# Altium footprint library NG2092.PcbLib: 32 footprints (part 2 of 2)
Each footprint in its own frame and in the unit in brackets; x right, y up, seen from the top. Pads: shape width x height; smd on the part's side, far side on the other; paste and mask are expansions set on the pad; w line width, h text height; cw(c..) or ccw(c..) is an arc to the next point about the centre after c.
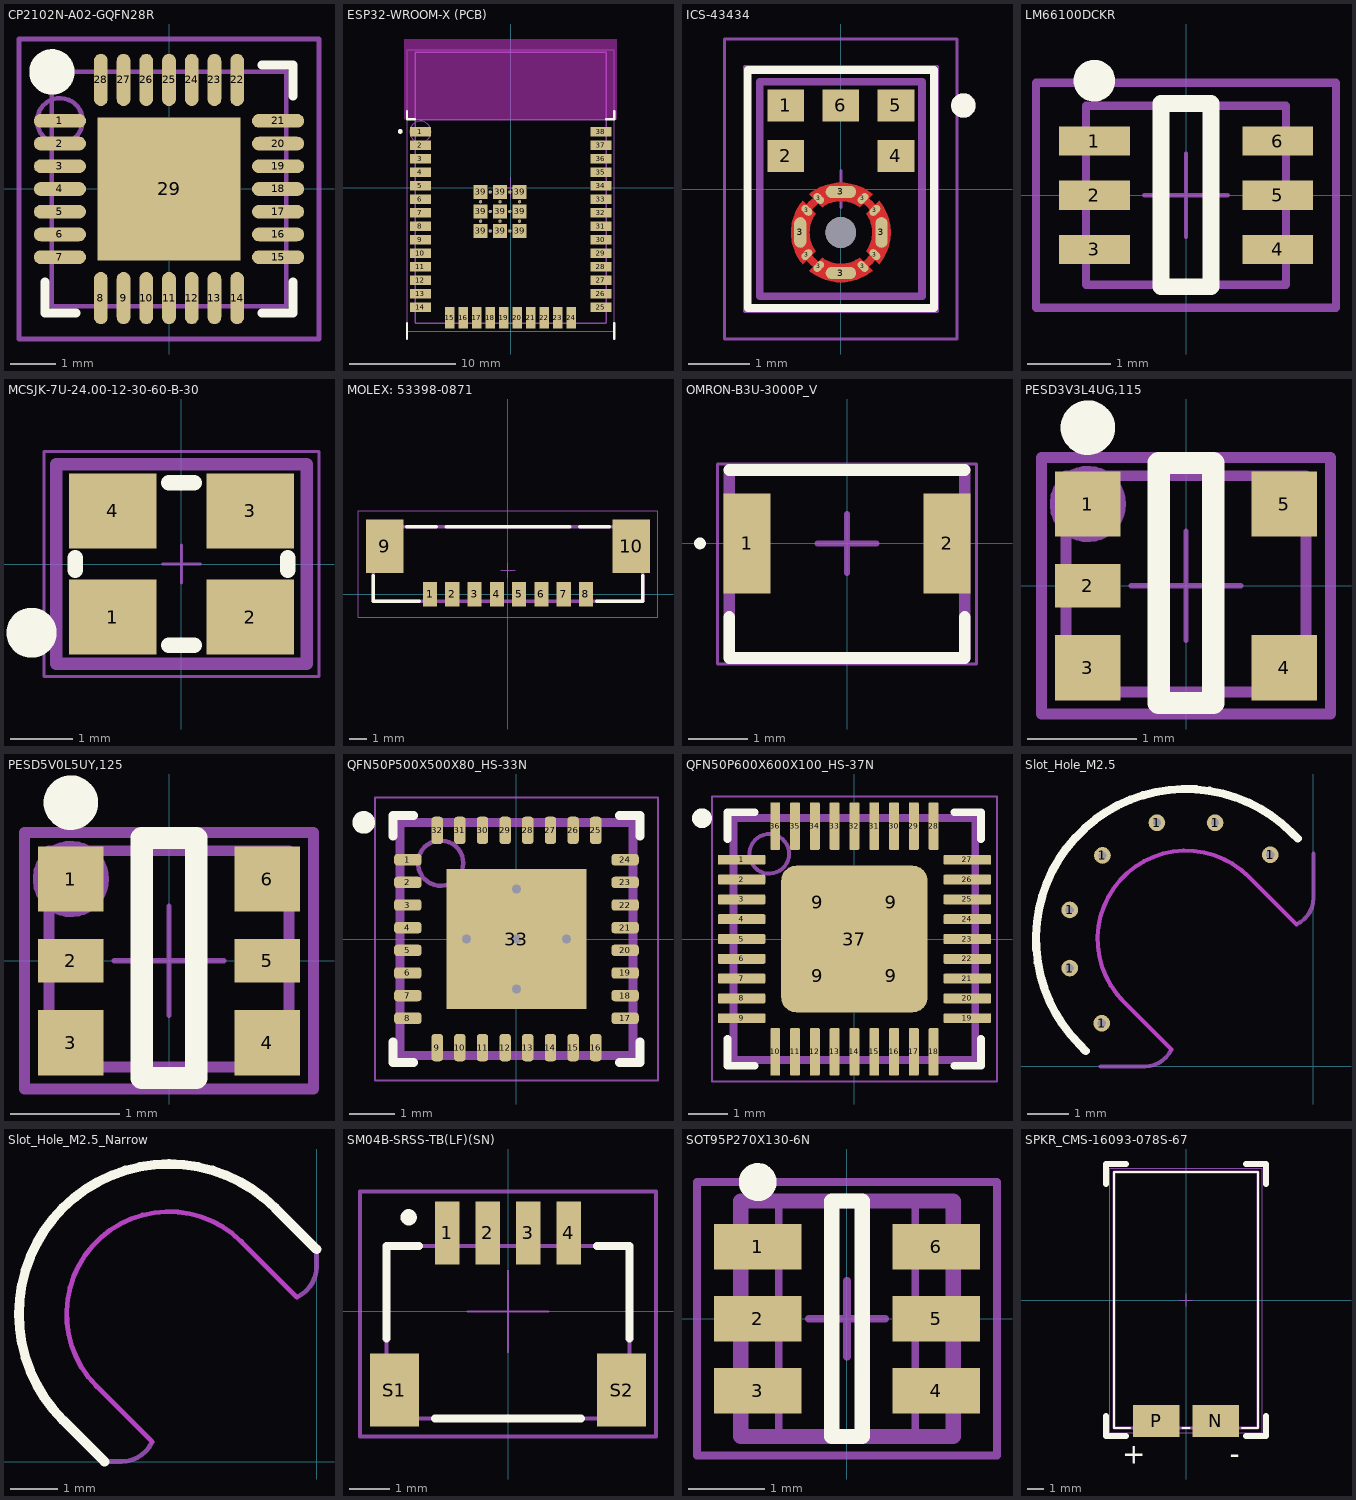
[diagram p1: the footprints below, top view; thin cyan lines are the x and y axes]

## CP2102N-A02-GQFN28R [mm] "QFN, 28-Leads, Body 5.00x5.00mm, Pitch 0.50mm, Thermal Pad 3.15x3.15mm, IPC Medium Density"
height 1
pads (29):
  oval 1.15x0.3 smd: 1(-2.4,1.5) 2(-2.4,1) 3(-2.4,0.5) 4(-2.4,0) 5(-2.4,-0.5) 6(-2.4,-1) 7(-2.4,-1.5) 15(2.4,-1.5) 16(2.4,-1) 17(2.4,-0.5) 18(2.4,0) 19(2.4,0.5) 20(2.4,1) 21(2.4,1.5)
  oval 0.3x1.15 smd: 8(-1.5,-2.4) 9(-1,-2.4) 10(-0.5,-2.4) 11(0,-2.4) 12(0.5,-2.4) 13(1,-2.4) 14(1.5,-2.4) 22(1.5,2.4) 23(1,2.4) 24(0.5,2.4) 25(0,2.4) 26(-0.5,2.4) 27(-1,2.4) 28(-1.5,2.4)
  rect 3.15x3.15 smd paste-0.635: 29(0,0)
Top Overlay:
  circle w0.5: c-2.575,2.575 r0.25
  lines w0.2: -2.725,-2.05 -2.725,-2.725 -2.05,-2.725 ; 2.05,-2.725 2.725,-2.725 2.725,-2.05 ; 2.05,2.725 2.725,2.725 2.725,2.05
Top Assembly:
  circle w0.1: c-2.4,1.5 r0.5
  lines w0.1: -3.3,-3.3 3.3,-3.3 3.3,3.3 -3.3,3.3 -3.3,-3.3
  text "'.Designator'" at -2.418,-0.227 h1
Top Courtyard (Mech15):
  lines w0.05: -0.5,0 0.5,0 ; 0,-0.5 0,0.5 ; -3.3,-3.3 -3.3,3.3 3.3,3.3 3.3,-3.3 -3.3,-3.3
Top Component Outline (Mech31):
  lines w0.1: -2.575,-2.575 -2.575,2.575 2.575,2.575 2.575,-2.575 -2.575,-2.575
3D body: height 1, standoff 0.01, extent -2.575,-2.575 2.575,2.575

## ESP32-WROOM-X (PCB) [mm] "ESP32-WROOM modules, with space left for WROVER"
height 3.2
pads (59):
  rect 2x0.9 smd: 1(-8.5,5.26) 2(-8.5,3.99) 3(-8.5,2.72) 4(-8.5,1.45) 5(-8.5,0.18) 6(-8.5,-1.09) 7(-8.5,-2.36) 8(-8.5,-3.63) 9(-8.5,-4.9) 10(-8.5,-6.17) 11(-8.5,-7.44) 12(-8.5,-8.71) 13(-8.5,-9.98) 14(-8.5,-11.25) 25(8.5,-11.25) 26(8.5,-9.98) 27(8.5,-8.71) 28(8.5,-7.44) 29(8.5,-6.17) 30(8.5,-4.9) 31(8.5,-3.63) 32(8.5,-2.36) 33(8.5,-1.09) 34(8.5,0.18) 35(8.5,1.45) 36(8.5,2.72) 37(8.5,3.99) 38(8.5,5.26)
  rect 0.9x2 smd: 15(-5.715,-12.25) 16(-4.445,-12.25) 17(-3.175,-12.25) 18(-1.905,-12.25) 19(-0.635,-12.25) 20(0.635,-12.25) 21(1.905,-12.25) 22(3.175,-12.25) 23(4.445,-12.25) 24(5.715,-12.25)
  rect 1.33x1.33 smd: 39(-2.835,-4.075) 39(-2.835,-2.24) 39(-2.835,-0.405) 39(-1,-4.075) 39(-1,-2.24) 39(-1,-0.405) 39(0.835,-4.075) 39(0.835,-2.24) 39(0.835,-0.405)
  round 0.3 hole 0.2: 39(-2.835,-3.157) 39(-2.835,-1.322) 39(-1.917,-4.075) 39(-1.917,-2.24) 39(-1.917,-0.405) 39(-1,-3.157) 39(-1,-1.322) 39(-0.082,-4.075) 39(-0.082,-2.24) 39(-0.082,-0.405) 39(0.835,-3.157) 39(0.835,-1.322)
Top Overlay:
  circle w0.25: c-10.4,5.3 r0.1
  lines w0.2: -9.75,-14.244 -9.75,-13.494 -9.75,-12.744 ; -9.75,7.194 -9.75,6.444 -9,6.444 ; 9,6.444 9.75,6.444 9.75,7.194 ; 9.75,-14.25 9.75,-13.5 9.75,-12.75
Top Paste:
  region: 1.5,-4.74 0.17,-4.74 0.17,-3.41 1.5,-3.41
  region: -0.335,-2.905 -1.665,-2.905 -1.665,-1.575 -0.335,-1.575
  region: -2.17,-2.905 -3.5,-2.905 -3.5,-1.575 -2.17,-1.575
  region: 1.5,-2.905 0.17,-2.905 0.17,-1.575 1.5,-1.575
  region: 1.5,-1.07 0.17,-1.07 0.17,0.26 1.5,0.26
  region: -0.335,-1.07 -1.665,-1.07 -1.665,0.26 -0.335,0.26
  region: -2.17,-1.07 -3.5,-1.07 -3.5,0.26 -2.17,0.26
  region: -2.17,-4.74 -3.5,-4.74 -3.5,-3.41 -2.17,-3.41
  region: -0.335,-4.74 -1.665,-4.74 -1.665,-3.41 -0.335,-3.41
Top Solder:
  region: -0.335,-2.905 -1.665,-2.905 -1.665,-1.575 -0.335,-1.575
  region: -2.17,-2.905 -3.5,-2.905 -3.5,-1.575 -2.17,-1.575
  region: 1.5,-2.905 0.17,-2.905 0.17,-1.575 1.5,-1.575
  region: 1.5,-1.07 0.17,-1.07 0.17,0.26 1.5,0.26
  region: -0.335,-1.07 -1.665,-1.07 -1.665,0.26 -0.335,0.26
  region: -2.17,-1.07 -3.5,-1.07 -3.5,0.26 -2.17,0.26
  region: -2.17,-4.74 -3.5,-4.74 -3.5,-3.41 -2.17,-3.41
  region: -0.335,-4.74 -1.665,-4.74 -1.665,-3.41 -0.335,-3.41
  region: 1.5,-4.74 0.17,-4.74 0.17,-3.41 1.5,-3.41
Keep-Out Layer:
  region: 9,6.45 -9,6.45 -9,12.75 9,12.75
  region: 10,6.45 -10,6.45 -10,14 10,14
Top Assembly:
  circle w0.1: c-8.5,5.26 r1
  lines w0.1: -9.75,-13.494 -9.75,13 9.75,13 9.75,-13.5 ; -9.75,6 -9.75,-13.5 9.75,-13.5 ; -9.75,6.444 9.75,6.444 ; 9.75,6 9.75,-13.5
  text "'.Designator'" at -2.418,-0.227 h1
  text "PCB ANTENNA" at -6,9 h2
  text "WROOM" at -2,-12.739 h1
Top 3D Body:
Top Courtyard (Mech15):
  lines w0.05: -9.75,-13.494 -9.75,13 9.75,13 9.75,-13.5 ; -9.75,6 -9.75,-13.5 9.75,-13.5 ; -1,0 0,0 ; 0,-1 0,0 ; 0,1 0,0 ; 1,0 0,0 ; 9.75,6 9.75,-13.5
Top Component Outline (Mech31):
  lines w0.127: -9,-12.75 9,-12.75 ; -9,-12.74 -9,6.4 ; -9,12.7 -9,6.4 ; -9,12.75 9,12.75 ; 9,-12.74 9,6.4 ; 9,12.7 9,6.4 ; -9,6.4 9,6.4
3D body "ESP32-WROOM-32D--3DModel-STEP-56544.STEP": height 3.3, standoff 0.05, extent -9,-12.74 9,12.76

## ICS-43434 [mm]
pads (18):
  rect 0.6x0.522 smd mask+0.05: 1(-0.9,1.364) 2(-0.9,0.542) 4(0.9,0.542) 5(0.9,1.364) 6(0,1.364)
  oval 0.2x0.5 smd paste-1 mask+0: 3(-0.663,-0.71) 3(0.663,-0.71)
  oval 0.2x0.125 smd rot 45 paste-1 mask+0: 3(-0.555,-1.071) 3(-0.361,-1.265) 3(0.361,-0.155) 3(0.555,-0.349)
  oval 0.2x0.125 smd rot 135 paste-1 mask+0: 3(-0.555,-0.349) 3(-0.361,-0.155) 3(0.361,-1.265) 3(0.555,-1.071)
  oval 0.5x0.2 smd paste-1 mask+0: 3(0,-1.372) 3(0,-0.048)
  round 0.5 hole 0.5 unplated: ""(0,-0.71)
Top Layer:
  region: 0.037,0.102 0.075,0.099 0.112,0.095 0.149,0.089 0.186,0.081 0.222,0.071 0.258,0.06 0.293,0.047 0.328,0.033 0.362,0.017 0.395,-0.001 0.427,-0.02 0.458,-0.041 0.489,-0.063 0.518,-0.086 0.306,-0.298 0.284,-0.283 0.266,-0.271 0.247,-0.26 0.228,-0.25 0.208,-0.241 0.188,-0.233 0.167,-0.225 0.146,-0.219 0.125,-0.213 0.104,-0.208 0.082,-0.204 0.061,-0.201 0.039,-0.199 0.017,-0.198 -0.004,-0.197 -0.026,-0.198 -0.048,-0.2 -0.07,-0.202 -0.091,-0.205 -0.113,-0.21 -0.134,-0.215 -0.155,-0.221 -0.176,-0.228 -0.196,-0.236 -0.216,-0.245 -0.236,-0.254 -0.255,-0.265 -0.273,-0.276 -0.292,-0.288 -0.306,-0.298 -0.518,-0.086 -0.489,-0.063 -0.458,-0.041 -0.427,-0.02 -0.395,-0.001 -0.362,0.017 -0.328,0.033 -0.293,0.047 -0.258,0.06 -0.222,0.071 -0.186,0.081 -0.149,0.089 -0.112,0.095 -0.075,0.099 -0.037,0.102 0,0.103
  region: 0.647,-0.221 0.669,-0.252 0.69,-0.283 0.709,-0.315 0.727,-0.348 0.743,-0.382 0.757,-0.417 0.77,-0.452 0.781,-0.488 0.791,-0.524 0.799,-0.561 0.805,-0.598 0.809,-0.635 0.812,-0.673 0.813,-0.71 0.812,-0.747 0.809,-0.785 0.805,-0.822 0.799,-0.859 0.791,-0.896 0.781,-0.932 0.77,-0.968 0.757,-1.003 0.743,-1.038 0.727,-1.072 0.709,-1.105 0.69,-1.137 0.669,-1.168 0.647,-1.199 0.624,-1.228 0.412,-1.016 0.422,-1.002 0.434,-0.983 0.445,-0.965 0.456,-0.946 0.465,-0.926 0.474,-0.906 0.482,-0.886 0.489,-0.865 0.495,-0.844 0.5,-0.823 0.505,-0.801 0.508,-0.78 0.51,-0.758 0.512,-0.736 0.513,-0.714 0.512,-0.693 0.511,-0.671 0.509,-0.649 0.506,-0.628 0.502,-0.606 0.497,-0.585 0.491,-0.564 0.485,-0.543 0.477,-0.522 0.469,-0.502 0.46,-0.482 0.45,-0.463 0.439,-0.444 0.427,-0.426 0.412,-0.404 0.624,-0.192
  region: 0.518,-1.334 0.489,-1.357 0.458,-1.379 0.427,-1.4 0.395,-1.419 0.362,-1.437 0.328,-1.453 0.293,-1.467 0.258,-1.48 0.222,-1.491 0.186,-1.501 0.149,-1.509 0.112,-1.515 0.075,-1.519 0.037,-1.522 0,-1.523 -0.037,-1.522 -0.075,-1.519 -0.112,-1.515 -0.149,-1.509 -0.186,-1.501 -0.222,-1.491 -0.258,-1.48 -0.293,-1.467 -0.328,-1.453 -0.362,-1.437 -0.395,-1.419 -0.427,-1.4 -0.458,-1.379 -0.489,-1.357 -0.518,-1.334 -0.306,-1.122 -0.292,-1.132 -0.273,-1.144 -0.255,-1.155 -0.236,-1.166 -0.216,-1.175 -0.196,-1.184 -0.176,-1.192 -0.155,-1.199 -0.134,-1.205 -0.113,-1.21 -0.091,-1.215 -0.07,-1.218 -0.048,-1.22 -0.026,-1.222 -0.004,-1.223 0.017,-1.222 0.039,-1.221 0.061,-1.219 0.082,-1.216 0.104,-1.212 0.125,-1.207 0.146,-1.201 0.167,-1.195 0.188,-1.187 0.208,-1.179 0.228,-1.17 0.247,-1.16 0.266,-1.149 0.284,-1.137 0.306,-1.122
  region: -0.412,-0.404 -0.427,-0.425 -0.438,-0.444 -0.449,-0.462 -0.459,-0.481 -0.468,-0.501 -0.477,-0.521 -0.484,-0.541 -0.491,-0.561 -0.497,-0.582 -0.501,-0.603 -0.506,-0.624 -0.509,-0.646 -0.511,-0.667 -0.512,-0.688 -0.513,-0.71 -0.512,-0.732 -0.511,-0.753 -0.509,-0.774 -0.506,-0.796 -0.501,-0.817 -0.497,-0.838 -0.491,-0.859 -0.484,-0.879 -0.477,-0.899 -0.468,-0.919 -0.459,-0.939 -0.449,-0.958 -0.438,-0.976 -0.427,-0.995 -0.412,-1.016 -0.624,-1.228 -0.647,-1.199 -0.669,-1.168 -0.69,-1.137 -0.709,-1.105 -0.727,-1.072 -0.743,-1.038 -0.757,-1.003 -0.77,-0.968 -0.781,-0.932 -0.791,-0.896 -0.799,-0.859 -0.805,-0.822 -0.809,-0.785 -0.812,-0.747 -0.813,-0.71 -0.812,-0.673 -0.809,-0.635 -0.805,-0.598 -0.799,-0.561 -0.791,-0.524 -0.781,-0.488 -0.77,-0.452 -0.757,-0.417 -0.743,-0.382 -0.727,-0.348 -0.709,-0.315 -0.69,-0.283 -0.669,-0.252 -0.647,-0.221 -0.624,-0.192
  lines w0.125: 0,-1.372 ccw(c0,-0.71) 0.663,-0.71 ccw(c0,-0.71) 0,-0.048 ccw(c0,-0.71) -0.663,-0.71 ccw(c0,-0.71) 0,-1.372 ; 0,-1.372 0,-1.372 ; 0,-1.372 0,-1.372
Top Overlay:
  circle w0.2: c2,1.364 r0.1
  lines w0.127: -1.52,-1.945 1.52,-1.945 1.52,1.945 -1.52,1.945 -1.52,-1.945
Top Paste:
  drawing of 4 lines, arcs and shapes, not listed
Top Solder:
  drawing of 4 lines, arcs and shapes, not listed
Top Assembly:
  lines w0.05: -1.575,-2 1.575,-2 1.575,2 -1.575,2 -1.575,-2
  text "'.Designator'" at -2.418,-0.227 h1
Top Courtyard (Mech15):
  lines w0.05: -0.3,0 0.3,0 ; 0,-0.3 0,0.3 ; -1.9,-2.45 -1.9,2.45 1.9,2.45 1.9,-2.45 -1.9,-2.45
Top Component Outline (Mech31):
  circle w0.2: c2,1.364 r0.1
  lines w0.127: -1.325,-1.75 1.325,-1.75 1.325,1.75 -1.325,1.75 -1.325,-1.75
3D body "ICS-43434--3DModel-STEP-56544.STEP": height 0.98, standoff 0, extent -1.325,-1.75 1.325,1.75

## LM66100DCKR [mm] "SOT23, 6-Leads, Body 2.00x2.10mm, Pitch 0.65mm, IPC Medium Density"
height 1.1
pads (6):
  rect 0.85x0.35 smd: 1(-1.1,0.65) 2(-1.1,0) 3(-1.1,-0.65) 4(1.1,-0.65) 5(1.1,0) 6(1.1,0.65)
Top Overlay:
  circle w0.25: c-1.1,1.375 r0.125
  lines w0.2: -0.3,-1.1 -0.3,1.1 0.3,1.1 0.3,-1.1 -0.3,-1.1
Top Assembly:
  lines w0.1: -1.8,-1.35 1.8,-1.35 1.8,1.35 -1.8,1.35 -1.8,-1.35
  text "'.Designator'" at -2.418,-0.227 h1
Top Courtyard (Mech15):
  lines w0.05: -0.5,0 0.5,0 ; 0,-0.5 0,0.5 ; -1.8,-1.35 1.8,-1.35 1.8,1.35 -1.8,1.35 -1.8,-1.35
Top Component Outline (Mech31):
  lines w0.1: -1.2,-1.075 1.2,-1.075 1.2,1.075 -1.2,1.075 -1.2,-1.075
3D body "SOT65P210X110-6N.step": height 1.1, standoff 0, extent -1.2,-1.075 1.2,1.075

## MCSJK-7U-24.00-12-30-60-B-30 [mm]
pads (4):
  rect 1.4x1.2 smd paste-10 mask+0.05: 1(-1.1,-0.85) 2(1.1,-0.85) 3(1.1,0.85) 4(-1.1,0.85)
Top Overlay:
  circle w0.4: c-2.4,-1.1 r0.2
  lines w0.254: -1.7,-0.1 -1.7,0.1 ; -0.2,-1.3 0.2,-1.3 ; -0.2,1.3 0.2,1.3 ; 1.7,-0.1 1.7,0.1
Top Assembly:
  lines w0.05: -2.2,-1.8 2.2,-1.8 2.2,1.8 -2.2,1.8 -2.2,-1.8
  text "'.Designator'" at -2.418,-0.227 h1
Top Courtyard (Mech15):
  lines w0.05: -0.3,0 0.3,0 ; 0,-0.3 0,0.3 ; -2.2,-1.8 2.2,-1.8 2.2,1.8 -2.2,1.8 -2.2,-1.8
Top Component Outline (Mech31):
  lines w0.2: -2,-1.6 -2,1.6 2,1.6 2,-1.6 -2,-1.6
3D body "User Library-Crystal_ECX-32.STEP": height 0.82, standoff 0, extent -1.6,-1.25 1.6,1.25

## MOLEX: 53398-0871 [mm] "SMD Connector; Wafer; 8 Position, Vertical"
pads (10):
  rect 0.8x1.4 smd: 1(-4.375,0) 2(-3.125,0) 3(-1.875,0) 4(-0.625,0) 5(0.625,0) 6(1.875,0) 7(3.125,0) 8(4.375,0)
  rect 2.1x3 smd: 9(-6.925,2.7) 10(6.925,2.7)
Top Overlay:
  lines w0.2: -7.575,1.05 -7.575,-0.4 -5,-0.4 ; -5.675,3.8 -4.025,3.8 ; -3.475,3.8 3.475,3.8 ; 4.025,3.8 5.675,3.8 ; 5,-0.4 7.575,-0.4 7.575,1.05
Top Assembly:
  lines w0.05: -8.4,-1.3 -8.4,4.7 8.4,4.7 8.4,-1.3 -8.4,-1.3
  text "'.Designator'" at -2.418,2.523 h1
Top Courtyard (Mech15):
  lines w0.05: -0.4,1.35 0.4,1.35 ; 0,0.95 0,1.75 ; -8.4,-1.3 -8.4,4.7 8.4,4.7 8.4,-1.3 -8.4,-1.3
Top Component Outline (Mech31):
  lines w0.2: -7.575,-0.4 -7.575,3.8 7.575,3.8 7.575,-0.4 -7.575,-0.4
3D body "533980871.stp": height 4.67, standoff -0.02, extent -7.575,-0.35 7.575,3.85

## OMRON-B3U-3000P_V [mm] "SMD, 2-Leads, Body 4x3.2mm"
height 1.35
pads (2):
  rect 0.8x1.7 smd: 1(-1.7,0) 2(1.7,0)
Top Overlay:
  circle w0.1: c-2.5,0 r0.05
  lines w0.2: -2,-1.25 -2,-1.95 2,-1.95 2,-1.25 ; -2,1.25 2,1.25
Top Assembly:
  lines w0.05: -2.2,-2.05 2.2,-2.05 2.2,1.35 -2.2,1.35 -2.2,-2.05
  text "'.Designator'" at -2.418,-0.227 h1
Top 3D Body (Mech13):
  lines w0.1: -2,-1.95 -2,1.25 2,1.25 2,-1.95 -2,-1.95
Top Courtyard (Mech15):
  lines w0.05: -2.2,-2.05 2.2,-2.05 2.2,1.35 -2.2,1.35 -2.2,-2.05
  lines w0.1: -0.5,0 0.5,0 ; 0,-0.5 0,0.5
Top Component Outline (Mech31):
  lines w0.2: -2,-1.95 2,-1.95 2,1.25 -2,1.25 -2,-1.95
3D body "B3U_3000P[].step": height 1.2, standoff 0, extent -2,-1.95 2,1.25

## PESD3V3L4UG,115 [mm] "5-TSSOP, SC-88, SOT-363"
height 1.1
pads (5):
  rect 0.6x0.6 smd mask+0.076: 1(-0.9,0.75) 3(-0.9,-0.75) 4(0.9,-0.75) 5(0.9,0.75)
  rect 0.6x0.4 smd mask+0.076: 2(-0.9,0)
Top Overlay:
  circle w0.25: c-0.9,1.45 r0.125
  lines w0.203: -0.25,-1.075 0.25,-1.075 0.25,1.125 -0.25,1.125 -0.25,-1.075
Top Assembly:
  circle w0.1: c-0.9,0.75 r0.3
  lines w0.1: -1.325,-1.175 -1.325,1.175 1.325,1.175 1.325,-1.175 -1.325,-1.175
  text "'.Designator'" at -2.418,-0.227 h1
Top Courtyard (Mech15):
  lines w0.05: -0.5,0 0.5,0 ; 0,-0.5 0,0.5 ; -1.325,-1.175 -1.325,1.175 1.325,1.175 1.325,-1.175 -1.325,-1.175
Top Component Outline (Mech31):
  lines w0.1: -1.1,-0.975 1.1,-0.975 1.1,1.009 -1.1,1.009 -1.1,-0.975
3D body "SOT65P210X110-6N.STEP": height 0.99, standoff -0.01, extent -1.1,-0.994 1.1,0.994

## PESD5V0L5UY,125 [mm] "6-TSSOP, SC-88, SOT-363"
height 1.1
pads (6):
  rect 0.6x0.6 smd mask+0.076: 1(-0.9,0.75) 3(-0.9,-0.75) 4(0.9,-0.75) 6(0.9,0.75)
  rect 0.6x0.4 smd mask+0.076: 2(-0.9,0) 5(0.9,0)
Top Overlay:
  circle w0.25: c-0.9,1.45 r0.125
  lines w0.203: -0.25,-1.075 0.25,-1.075 0.25,1.125 -0.25,1.125 -0.25,-1.075
Top Assembly:
  circle w0.1: c-0.9,0.75 r0.3
  lines w0.1: -1.325,-1.175 -1.325,1.175 1.325,1.175 1.325,-1.175 -1.325,-1.175
  text "'.Designator'" at -2.418,-0.227 h1
Top Courtyard (Mech15):
  lines w0.05: -0.5,0 0.5,0 ; 0,-0.5 0,0.5 ; -1.325,-1.175 -1.325,1.175 1.325,1.175 1.325,-1.175 -1.325,-1.175
Top Component Outline (Mech31):
  lines w0.1: -1.1,-0.975 1.1,-0.975 1.1,1.009 -1.1,1.009 -1.1,-0.975
3D body "SOT65P210X110-6N.STEP": height 0.99, standoff -0.01, extent -1.1,-0.994 1.1,0.994

## QFN50P500X500X80_HS-33N [mm] "QFN-32, 32-Leads, Body 5,00x5,00mm, Pitch 0,50mm, Thermal Pad 3,10x3,10mm, IPC Medium Density"
height 0.8
pads (33):
  rrect50% 0.6x0.25 smd paste+0 mask+0.05: 1(-2.4,1.75) 2(-2.4,1.25) 3(-2.4,0.75) 4(-2.4,0.25) 5(-2.4,-0.25) 6(-2.4,-0.75) 7(-2.4,-1.25) 8(-2.4,-1.75) 17(2.4,-1.75) 18(2.4,-1.25) 19(2.4,-0.75) 20(2.4,-0.25) 21(2.4,0.25) 22(2.4,0.75) 23(2.4,1.25) 24(2.4,1.75)
  rrect50% 0.25x0.6 smd paste+0 mask+0.05: 9(-1.75,-2.4) 10(-1.25,-2.4) 11(-0.75,-2.4) 12(-0.25,-2.4) 13(0.25,-2.4) 14(0.75,-2.4) 15(1.25,-2.4) 16(1.75,-2.4) 25(1.75,2.4) 26(1.25,2.4) 27(0.75,2.4) 28(0.25,2.4) 29(-0.25,2.4) 30(-0.75,2.4) 31(-1.25,2.4) 32(-1.75,2.4)
  rect 3.1x3.1 smd paste-10 mask+0.05: 33(0,0)
via 0,-1.1 diameter 0.5 hole 0.2
via 1.1,0 diameter 0.5 hole 0.2
via 0,0 diameter 0.5 hole 0.2
via -1.1,0 diameter 0.5 hole 0.2
via 0,1.1 diameter 0.5 hole 0.2
Top Overlay:
  circle w0.25: c-3.375,2.575 r0.125
  lines w0.2: -2.725,-2.275 -2.725,-2.725 -2.275,-2.725 ; -2.725,2.275 -2.725,2.725 -2.275,2.725 ; 2.275,-2.725 2.725,-2.725 2.725,-2.275 ; 2.275,2.725 2.725,2.725 2.725,2.275
Top Paste:
  rectangle: 0.15,-1.5 1.5,-0.15
  region: -0.15,-0.15 -1.5,-0.15 -1.5,-1.5 -0.15,-1.5
  region: -0.15,1.5 -1.5,1.5 -1.5,0.15 -0.15,0.15
  rectangle: 0.15,0.15 1.5,1.5
Top Assembly:
  circle w0.1: c-1.675,1.675 r0.5
  lines w0.1: -2.575,-2.575 2.575,-2.575 2.575,2.575 -2.575,2.575 -2.575,-2.575
  text "'.Designator'" at -2.418,-0.227 h1
Top Courtyard (Mech15):
  lines w0.05: -3.125,-3.125 3.125,-3.125 3.125,3.125 -3.125,3.125 -3.125,-3.125
  lines w0.1: -0.5,0 0.5,0 ; 0,-0.5 0,0.5
Top Component Outline (Mech31):
  lines w0.2: -2.575,-2.575 2.575,-2.575 2.575,2.575 -2.575,2.575 -2.575,-2.575
3D body "QFN50P500X500X80_HS-33N.step": height 0.8, standoff 0, extent -2.625,-2.625 2.625,2.625

## QFN50P600X600X100_HS-37N [mm] "QFN, 36-Leads, Body 6,00x6,00mm, Pitch 0,50mm, Thermal Pad 3,70x3,70mm, IPC Medium Density"
height 1
pads (41):
  rrect25% 1.2x0.25 smd paste-0.02 mask+0.05: 1(-2.85,2) 2(-2.85,1.5) 3(-2.85,1) 4(-2.85,0.5) 5(-2.85,0) 6(-2.85,-0.5) 7(-2.85,-1) 8(-2.85,-1.5) 9(-2.85,-2) 19(2.85,-2) 20(2.85,-1.5) 21(2.85,-1) 22(2.85,-0.5) 23(2.85,0) 24(2.85,0.5) 25(2.85,1) 26(2.85,1.5) 27(2.85,2)
  rrect25% 1.3x1.3 on Top Paste paste+0 mask-10: 9(-0.925,-0.925) 9(-0.925,0.925) 9(0.925,-0.925) 9(0.925,0.925)
  rrect25% 0.25x1.2 smd paste-0.02 mask+0.05: 10(-2,-2.85) 11(-1.5,-2.85) 12(-1,-2.85) 13(-0.5,-2.85) 14(0,-2.85) 15(0.5,-2.85) 16(1,-2.85) 17(1.5,-2.85) 18(2,-2.85) 28(2,2.85) 29(1.5,2.85) 30(1,2.85) 31(0.5,2.85) 32(0,2.85) 33(-0.5,2.85) 34(-1,2.85) 35(-1.5,2.85) 36(-2,2.85)
  rrect20% 3.7x3.7 smd paste-10 mask+0.05: 37(0,0)
Top Overlay:
  circle w0.25: c-3.85,3.05 r0.125
  lines w0.2: -3.2,-2.525 -3.2,-3.2 -2.525,-3.2 ; -3.2,2.525 -3.2,3.2 -2.525,3.2 ; 2.525,-3.2 3.2,-3.2 3.2,-2.525 ; 2.525,3.2 3.2,3.2 3.2,2.525
Top Assembly:
  lines w0.05: -3.6,-3.6 3.6,-3.6 3.6,3.6 -3.6,3.6 -3.6,-3.6
  text "'.Designator'" at -2.418,-0.227 h1
Top 3D Body (Mech13):
  circle w0.1: c-2.15,2.15 r0.5
  lines w0.1: -3.05,-3.05 3.05,-3.05 3.05,3.05 -3.05,3.05 -3.05,-3.05
Top Courtyard (Mech15):
  lines w0.05: -3.6,-3.6 3.6,-3.6 3.6,3.6 -3.6,3.6 -3.6,-3.6
  lines w0.1: -0.5,0 0.5,0 ; 0,-0.5 0,0.5
Top Component Outline (Mech31):
  lines w0.2: -3.05,-3.05 -3.05,3.05 3.05,3.05 3.05,-3.05 -3.05,-3.05
3D body "QFN50P600X600X100_HS-37N.step": height 1, standoff 0, extent -3.1,-3.1 3.1,3.1

## Slot_Hole_M2.5 [mm]
pads (7):
  round 0.406 hole 0.203 paste-10 mask+0.05: 1(-5.93,2.393) 1(-5.93,3.807) 1(-5.152,1.049) 1(-5.134,5.133) 1(-3.808,5.928) 1(-2.394,5.928) 1(-1.051,5.151)
Top Overlay:
  lines w0.2: -5.543,0.376 -5.682,0.516 -5.682,0.519 cw(c-3.101,3.1) -0.52,5.681 -0.382,5.542
Top Solder:
  region: -5.682,0.519 -5.125,0 -3.455,0 -3.455,0.413 -4.622,1.58
  region: 0,3.454 0,5.125 -0.52,5.681 -1.581,4.62 -0.414,3.454
  lines w1.5: -5.152,1.049 cw(c-3.101,3.1) -1.051,5.151
Bottom Solder:
  region: -5.682,0.519 -5.125,0 -3.455,0 -3.455,0.413 -4.622,1.58
  region: 0,3.454 0,5.125 -0.52,5.681 -1.581,4.62 -0.414,3.454
  lines w1: -4.975,1.226 cw(c-3.101,3.1) -1.227,4.974
Keep-Out Layer:
  lines w0.1: -3.455,0.413 -4.622,1.58 cw(c-3.101,3.1) -1.581,4.62 -0.414,3.454
Board:
  lines w0.1: -5.176,0 -4.101,0 ccw(c-4.101,0.711) -3.457,0.41 ; -3.455,0.413 -4.622,1.58 cw(c-3.101,3.1) -1.581,4.62 -0.414,3.454 ; -0.411,3.457 ccw(c-0.711,4.1) -0.001,4.1 -0.001,5.175

## Slot_Hole_M2.5_Narrow [mm]
Top Overlay:
  lines w0.2: -4.455,0 -5.327,0.873 ; 0,4.455 -0.873,5.327 ccw(c-3.1,3.1) -5.327,0.873 ; -5.327,0.873 -5.327,0.873
Top Solder:
  region: -5.327,0.873 -4.455,0 -3.75,0.05 -3.453,0.413 -4.62,1.58
  region: -0.033,3.833 0,4.455 -0.873,5.327 -1.58,4.62 -0.413,3.454
  lines w1: -4.974,1.226 cw(c-3.1,3.1) -1.226,4.974
Bottom Solder:
  region: -0.033,3.833 0,4.455 -0.873,5.327 -1.58,4.62 -0.413,3.454
  region: -5.327,0.873 -4.455,0 -3.75,0.05 -3.453,0.413 -4.62,1.58
  lines w1: -4.974,1.226 cw(c-3.1,3.1) -1.226,4.974
Keep-Out Layer:
  lines w0.1: -3.453,0.413 -4.62,1.58 cw(c-3.1,3.1) -1.58,4.62 -0.413,3.454
Board:
  lines w0.1: -4.455,0 -4.1,0 ccw(c-4.1,0.711) -3.456,0.41 ; -3.453,0.413 -4.62,1.58 cw(c-3.1,3.1) -1.58,4.62 -0.413,3.454 ; -0.41,3.457 ccw(c-0.71,4.1) 0,4.1 0,4.455

## SM04B-SRSS-TB(LF)(SN) [mm] "Connector Header Surface Mount, Right Angle 4 position 0.039\" (1.00mm)"
height 2.9
pads (6):
  rect 0.6x1.55 smd: 1(-1.5,1.938) 2(-0.5,1.938) 3(0.5,1.938) 4(1.5,1.938)
  rect 1.2x1.8 smd: S1(-2.8,-1.937) S2(2.8,-1.937)
Top Overlay:
  circle w0.2: c-2.45,2.323 r0.1
  lines w0.2: -3,-0.662 -3,1.613 -2.2,1.613 ; -1.8,-2.637 1.8,-2.637 ; 2.2,1.613 3,1.613 3,-0.662
Top Assembly:
  lines w0.1: -3.65,-3.087 3.65,-3.087 3.65,2.963 -3.65,2.963 -3.65,-3.087
  text "'.Designator'" at -2.418,-0.227 h1
Top Courtyard (Mech15):
  lines w0.05: -1,0 0,0 ; 0,-1 0,0 ; 0,1 0,0 ; 1,0 0,0 ; -3.65,-3.087 -3.65,2.963 3.65,2.963 3.65,-3.087 -3.65,-3.087
Top Component Outline (Mech31):
  lines w0.1: -3,-2.637 -3,1.613 3,1.613 3,-2.637 -3,-2.637
3D body "SM04B-SRSS-TB(LF)(SN)--3DModel-STEP-56544.STEP": height 2.96, standoff 0, extent -3,-2.638 3,2.312

## SOT95P270X130-6N [mm] "SOT23, 6-Leads, Body 3,1x3,2mm (max), Pitch 0,95mm, IPC Medium Density"
height 1.3
pads (6):
  rect 1.15x0.6 smd mask+0.05: 1(-1.175,0.95) 2(-1.175,0) 3(-1.175,-0.95) 4(1.175,-0.95) 5(1.175,0) 6(1.175,0.95)
Top Overlay:
  circle w0.25: c-1.175,1.8 r0.125
  lines w0.2: -0.2,-1.55 0.2,-1.55 0.2,1.55 -0.2,1.55 -0.2,-1.55
Top Assembly:
  lines w0.1: -1.975,-1.8 -1.975,1.8 1.975,1.8 1.975,-1.8 -1.975,-1.8
  text "'.Designator'" at -2.418,-0.227 h1
Top 3D Body (Mech13):
  lines w0.1: -0.9,-1.55 -0.9,1.55 0.9,1.55 0.9,-1.55 -0.9,-1.55
Top Courtyard (Mech15):
  lines w0.1: -0.5,0 0.5,0 ; 0,-0.5 0,0.5 ; -1.975,-1.8 -1.975,1.8 1.975,1.8 1.975,-1.8 -1.975,-1.8
Top Component Outline (Mech31):
  lines w0.2: -1.4,-1.55 -0.2,-1.55 0.2,-1.55 1.4,-1.55 1.4,1.55 0.2,1.55 -0.2,1.55 -1.4,1.55 -1.4,-1.55
3D body: height 1.3, standoff 0.1, extent -0.9,-1.55 0.9,1.55

## SPKR_CMS-16093-078S-67 [mm]
pads (2):
  rect 2.9x2 smd: N(1.85,-7.55) P(-1.85,-7.55)
Top Overlay:
  lines w0.127: -3.505,-8 -4.5,-8 -4.5,8 4.5,8 4.5,-8 3.505,-8 ; -0.203,-8.001 0.203,-8.001
  lines w0.35: -5,-7.25 -5,-8.5 -3.75,-8.5 ; -5,7.25 -5,8.5 -3.75,8.5 ; 3.75,-8.5 5,-8.5 5,-7.25 ; 3.75,8.5 5,8.5 5,7.25
  text "-" at 2.75,-10.25 h1.27
  text "+" at -4,-10.25 h1.27
Top Assembly:
  lines w0.05: -4.75,-8.3 -4.75,8.25 4.75,8.25 4.75,-8.3 -4.75,-8.3
  text "'.Designator'" at -2.418,-0.227 h1
Top 3D Body (Mech13):
  lines w0.127: -4.5,-8 4.5,-8 4.5,8 -4.5,8 -4.5,-8
Top Courtyard (Mech15):
  lines w0.05: -0.4,0 0.4,0 ; 0,-0.4 0,0.4 ; -4.75,-8.3 4.75,-8.3 4.75,8.25 -4.75,8.25 -4.75,-8.3
Top Component Outline (Mech31):
  lines w0.2: -4.5,-8 4.5,-8 4.5,8 -4.5,8 -4.5,-8
3D body "CUI_DEVICES_CMS-16093-078S-67.step": height 4, standoff -0.04, extent -4.5,-8 4.5,8